# Altium footprint library lib_datalogger.PcbLib: 866 footprints (part 54 of 55)
Each footprint in its own frame and in the unit in brackets; x right, y up, seen from the top. Pads: shape width x height; smd on the part's side, far side on the other; paste and mask are expansions set on the pad; w line width, h text height; cw(c..) or ccw(c..) is an arc to the next point about the centre after c.
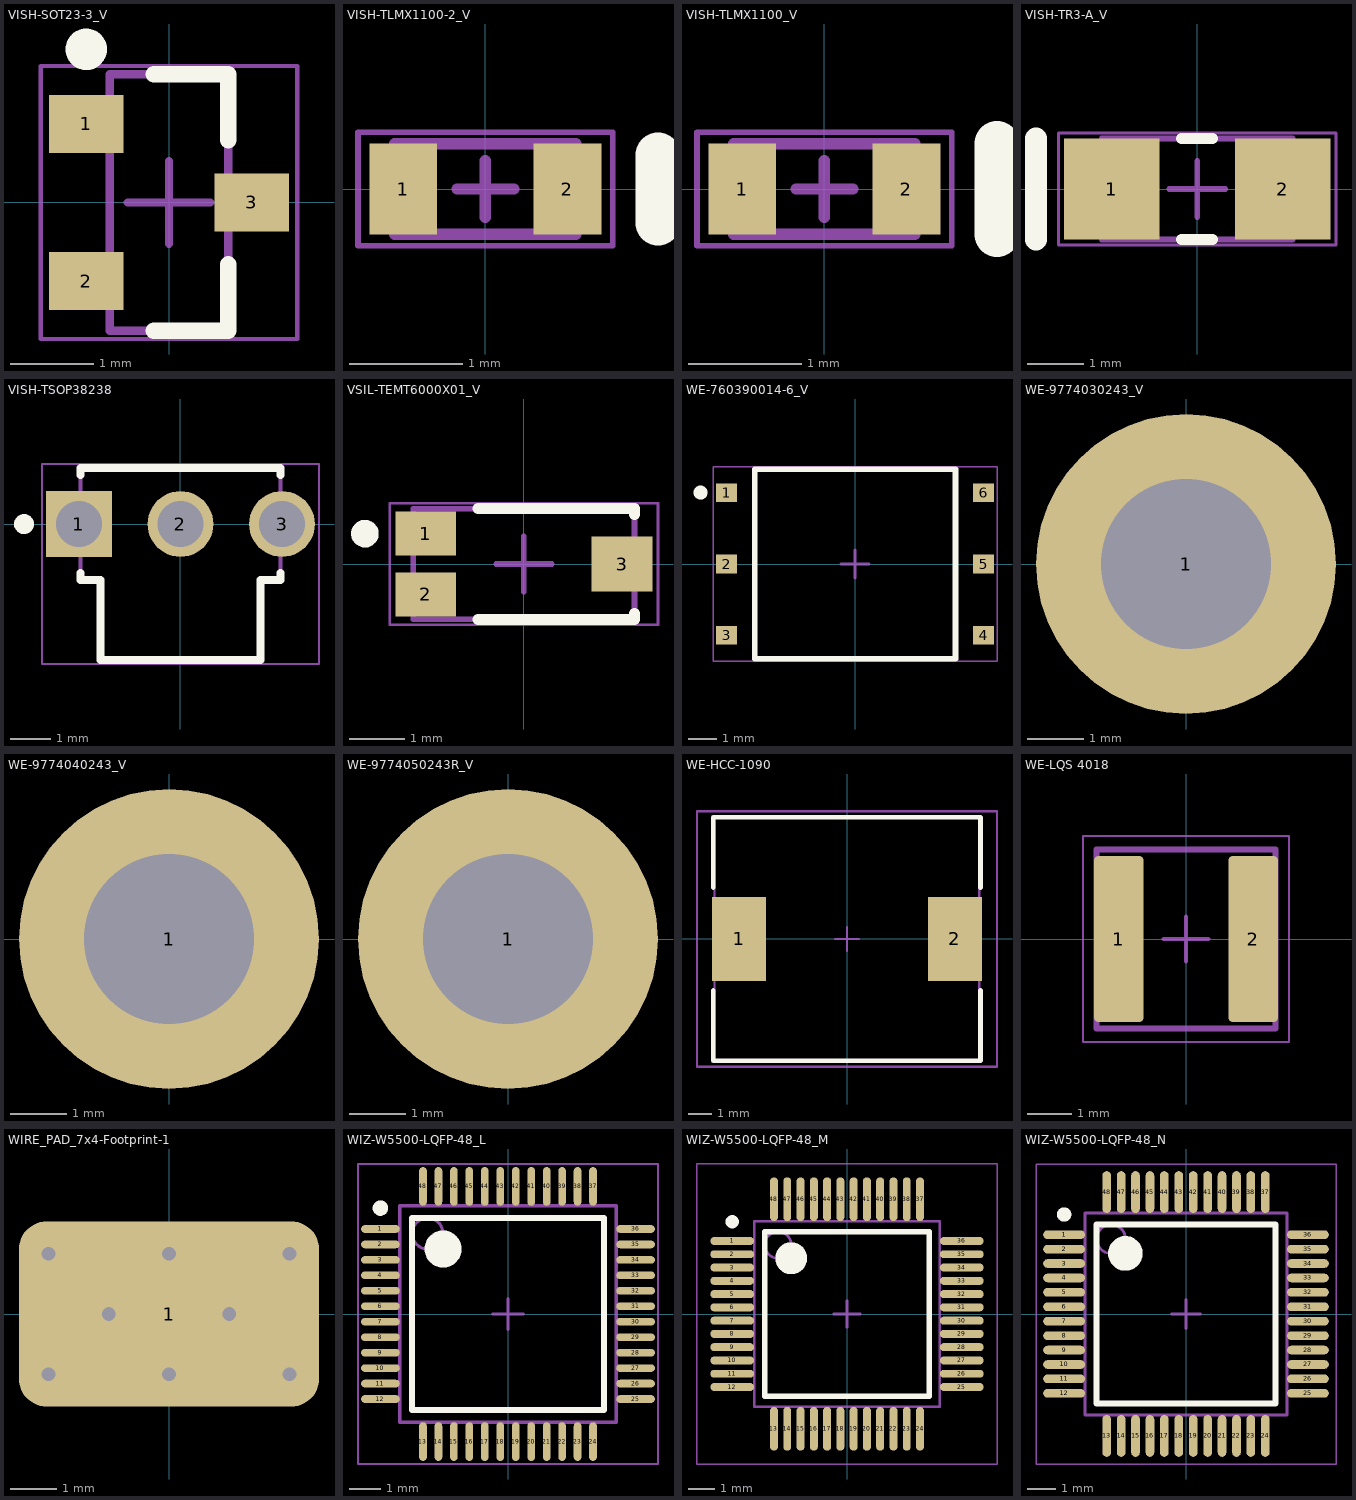
[diagram p53: the footprints below, top view; thin cyan lines are the x and y axes]

## VISH-SOT23-3_V [mm] "SOT23, 3-Leads, Body 3.1x1.43mm, Pitch 0.95mm"
height 1.15
pads (3):
  rect 0.9x0.7 smd: 1(-1,0.95) 2(-1,-0.95) 3(1,0)
Top Overlay:
  circle w0.25: c-1,1.85 r0.125
  lines w0.2: -0.185,-1.55 0.715,-1.55 0.715,-0.75 ; -0.185,1.55 0.715,1.55 0.715,0.75
Mechanical 13:
  lines w0.1: -0.715,-1.55 0.715,-1.55 0.715,1.55 -0.715,1.55 -0.715,-1.55
Mechanical 15:
  lines w0.05: -1.55,-1.65 1.55,-1.65 1.55,1.65 -1.55,1.65 -1.55,-1.65
  lines w0.1: -0.5,0 0.5,0 ; 0,-0.5 0,0.5
3D body "SOT95P248X115-3L.step": height 1.15, standoff 0, extent -1.3,-1.55 1.3,1.55

## VISH-TLMX1100-2_V [mm] "SMD, 2-Leads, Body 1.6x0.8mm"
height 0.65
pads (2):
  rect 0.6x0.8 smd: 1(-0.725,0) 2(0.725,0)
Top Overlay:
  lines w0.4: 1.525,-0.3 1.525,0.3
Mechanical 13:
  lines w0.1: -0.8,-0.4 0.8,-0.4 0.8,0.4 -0.8,0.4 -0.8,-0.4
Mechanical 15:
  lines w0.05: -1.125,-0.5 1.125,-0.5 1.125,0.5 -1.125,0.5 -1.125,-0.5
  lines w0.1: -0.25,0 0.25,0 ; 0,-0.25 0,0.25
3D body: height 0.65, standoff 0, extent -0.8,-0.4 0.8,0.4

## VISH-TLMX1100_V [mm] "SMD, 2-Leads, Body 1.6x0.8mm"
height 0.65
pads (2):
  rect 0.6x0.8 smd: 1(-0.725,0) 2(0.725,0)
Top Overlay:
  lines w0.4: 1.525,-0.4 1.525,0.4
Mechanical 13:
  lines w0.1: -0.8,-0.4 0.8,-0.4 0.8,0.4 -0.8,0.4 -0.8,-0.4
Mechanical 15:
  lines w0.05: -1.125,-0.5 -1.125,0.5 1.125,0.5 1.125,-0.5 -1.125,-0.5
  lines w0.1: -0.25,0 0.25,0 ; 0,-0.25 0,0.25
3D body: height 0.65, standoff 0, extent -0.8,-0.4 0.8,0.4

## VISH-TR3-A_V [mm] "Molded Capacitor, 2-Leads, Body 3.40x1.80mm"
height 1.8
pads (2):
  rect 1.7x1.8 smd: 1(-1.525,0) 2(1.525,0)
Top Overlay:
  lines w0.2: -0.275,-0.9 0.275,-0.9 ; -0.275,0.9 0.275,0.9
  lines w0.4: -2.875,-0.9 -2.875,0.9
Mechanical 13:
  rectangle: -1.7,-0.9 -1.243,0.9
  lines w0.1: -1.7,-0.9 1.7,-0.9 1.7,0.9 -1.7,0.9 -1.7,-0.9
Mechanical 15:
  lines w0.05: -2.475,-1 2.475,-1 2.475,1 -2.475,1 -2.475,-1
  lines w0.1: -0.5,0 0.5,0 ; 0,-0.5 0,0.5
3D body "CAPMP3216X18L.step": height 1.8, standoff 0, extent -1.92,-0.9 1.92,0.9

## VISH-TSOP38238 [mm] "TH, 3-Leads, Body 5.00x4.80mm, Pitch 2.54mm"
height 8.55
pads (3):
  rect 1.65x1.65 hole 1.15: 1(-2.54,0)
  round 1.65 hole 1.15: 2(0,0) 3(2.54,0)
Top Overlay:
  circle w0.25: c-3.915,0 r0.125
  lines w0.2: -2.5,-1.4 -2.5,-1.225 ; -2.5,1.225 -2.5,1.4 2.5,1.4 2.5,1.225 ; -2.5,-1.4 -2,-1.4 -2,-3.4 2,-3.4 2,-1.4 2.5,-1.4 2.5,-1.225
Mechanical 13:
  lines w0.1: -2.5,-1.4 -2,-1.4 -2,-3.4 2,-3.4 2,-1.4 2.5,-1.4 2.5,1.4 -2.5,1.4 -2.5,-1.4
Mechanical 15:
  lines w0.05: -3.465,-3.5 3.465,-3.5 3.465,1.5 -3.465,1.5 -3.465,-3.5
  lines w0.1: -0.5,0 0.5,0 ; 0,-0.5 0,0.5
3D body: height 1.3, standoff -22.83, extent -2.89,-0.25 -2.19,0.25
3D body: height 1.3, standoff -22.83, extent -0.35,-0.25 0.35,0.25
3D body: height 1.3, standoff -22.83, extent 2.19,-0.25 2.89,0.25
3D body: height 7.55, standoff 1.3, extent -2,-3.4 2,-1.4
3D body: height 8.55, standoff 1.3, extent -2.5,-1.4 2.5,1.4

## VSIL-TEMT6000X01_V [mm] "SMD, 3-Leads, Body 4x2mm"
height 1.2
pads (3):
  rect 1.1x0.8 smd: 1(-1.775,0.55) 2(-1.775,-0.55)
  rect 1.1x1 smd: 3(1.775,0)
Top Overlay:
  circle w0.25: c-2.875,0.55 r0.125
  lines w0.2: -0.828,-1 2,-1 2,-0.9 ; -0.828,1 2,1 2,0.9
Mechanical 13:
  lines w0.1: -2,-1 2,-1 2,1 -2,1 -2,-1
Mechanical 15:
  lines w0.05: -2.425,-1.1 -2.425,1.1 2.425,1.1 2.425,-1.1 -2.425,-1.1
  lines w0.1: -0.5,0 0.5,0 ; 0,-0.5 0,0.5
3D body: height 0.45, standoff 0, extent -2,-1 2,1
3D body: height 1.05, standoff 0.45, extent -1.2,-1 1.2,1

## WE-760390014-6_V [mm] "SMD, 6-Leads, Body 7.14x6.73mm, Pitch 2.54mm"
height 4.19
pads (6):
  rect 0.75x0.66 smd: 1(-4.57,2.54) 2(-4.57,0) 3(-4.57,-2.54) 4(4.57,-2.54) 5(4.57,0) 6(4.57,2.54)
Top Overlay:
  circle w0.25: c-5.495,2.54 r0.125
  lines w0.2: -3.57,-3.365 -3.57,3.365 3.57,3.365 3.57,-3.365 -3.57,-3.365
Mechanical 13:
  lines w0.1: -3.57,-3.365 -3.57,3.365 3.57,3.365 3.57,-3.365 -3.57,-3.365
Mechanical 15:
  lines w0.05: -5.045,-3.465 -5.045,3.465 5.045,3.465 5.045,-3.465 -5.045,-3.465
  lines w0.1: -0.5,0 0.5,0 ; 0,-0.5 0,0.5
3D body: height 4.19, standoff 0, extent -3.57,-3.365 3.57,3.365

## WE-9774030243_V [mm] "Round Standoff M2 Steel Spacer"
height 3
pads (1):
  round 5.3 / inner round 0 / far side round 0 hole 3: 1(0,0)
Mechanical 13:
  circle w0.05: c0,0 r2.225
  lines w0.1: -0.5,0 0.5,0 ; 0,-0.5 0,0.5
Top 3D Body:
  circle w0.1: c0,0 r2.175
Top Designator:
  text ".Designator" at -1.27,-3.175 h0.6
3D body "9774030243 (rev1).stp": height 3, standoff -1.4, extent -2.175,-2.172 2.175,2.172

## WE-9774040243_V [mm] "Round Standoff M2 Steel Spacer"
height 4
pads (1):
  round 5.3 / inner round 0 / far side round 0 hole 3: 1(0,0)
Mechanical 13:
  circle w0.05: c0,0 r2.225
  lines w0.1: -0.5,0 0.5,0 ; 0,-0.5 0,0.5
Top 3D Body:
  circle w0.1: c0,0 r2.175
Top Designator:
  text ".Designator" at -1.27,-3.683 h0.6
3D body "9774040243R (rev1).stp": height 4, standoff -1.4, extent -2.175,-2.172 2.175,2.172

## WE-9774050243R_V [mm] "Round Standoff M2 Steel Spacer"
height 5
pads (1):
  round 5.3 / inner round 0 / far side round 0 hole 3: 1(0,0)
Mechanical 13:
  circle w0.1: c0,0 r2.175
Mechanical 15:
  circle w0.05: c0,0 r2.225
  lines w0.1: -0.5,0 0.5,0 ; 0,-0.5 0,0.5
Top Designator:
  text ".Designator" at -1.397,-3.302 h0.6
3D body "9774050243R.stp": height 5, standoff -1.4, extent -2.175,-2.172 2.175,2.172

## WE-HCC-1090 [mm] "Inductor, 2-Leads, Body 10.9 x 10.0 mm"
height 9.7
pads (2):
  rect 2.3x3.6 smd: 1(-4.6,0) 2(4.6,0)
Top Overlay:
  lines w0.2: -5.7,-2.2 -5.7,-5.2 5.7,-5.2 5.7,-2.2 ; -5.7,2.2 -5.7,5.2 5.7,5.2 5.7,2.2
Mechanical 13:
  lines w0.1: -5.65,-5.2 -5.65,5.2 5.65,5.2 5.65,-5.2 -5.65,-5.2
Mechanical 15:
  lines w0.1: -0.5,0 0.5,0 ; 0,-0.5 0,0.5 ; -6.4,-5.45 -6.4,5.45 6.4,5.45 6.4,-5.45 -6.4,-5.45
3D body "744333xxxx.stp": height 9.29, standoff -0.01, extent -5.125,-5 5.125,5

## WE-LQS 4018 [mm] "SMD Power Inductor, 2-Leads, Body 4.0x4.0mm"
height 1.8
pads (2):
  rrect15% 1.1x3.7 smd: 1(-1.5,0) 2(1.5,0)
Mechanical 13:
  lines w0.127: -2,-2 2,-2 2,2 -2,2 -2,-2
Mechanical 15:
  lines w0.05: -2.3,-2.3 2.3,-2.3 2.3,2.3 -2.3,2.3 -2.3,-2.3
  lines w0.1: -0.5,0 0.5,0 ; 0,-0.5 0,0.5
Top Designator:
  text ".Designator" at 0.127,-1.27 h0.6
3D body "LQS_4018.stp": height 1.78, standoff -0.02, extent -2,-2 2,2

## WIRE_PAD_7x4-Footprint-1 [mm]
pads (1):
  rrect30% 6.472x4 smd mask+0.102: 1(0,0)
via -2.6,-1.3 diameter 0.6 hole 0.3
via -2.6,1.3 diameter 0.6 hole 0.3
via 0,1.3 diameter 0.6 hole 0.3
via 0,-1.3 diameter 0.6 hole 0.3
via 2.6,1.3 diameter 0.6 hole 0.3
via 2.6,-1.3 diameter 0.6 hole 0.3
via 1.3,0 diameter 0.6 hole 0.3
via -1.3,0 diameter 0.6 hole 0.3
Top Designator:
  text ".Designator" at -2.159,2.413 h0.6

## WIZ-W5500-LQFP-48_L [mm] "LQFP, 48-Leads, Body 7.00x7.00mm, Pitch 0.50mm, IPC High Density"
height 1.6
pads (48):
  oval 1.25x0.25 smd: 1(-4.125,2.75) 2(-4.125,2.25) 3(-4.125,1.75) 4(-4.125,1.25) 5(-4.125,0.75) 6(-4.125,0.25) 7(-4.125,-0.25) 8(-4.125,-0.75) 9(-4.125,-1.25) 10(-4.125,-1.75) 11(-4.125,-2.25) 12(-4.125,-2.75) 25(4.125,-2.75) 26(4.125,-2.25) 27(4.125,-1.75) 28(4.125,-1.25) 29(4.125,-0.75) 30(4.125,-0.25) 31(4.125,0.25) 32(4.125,0.75) 33(4.125,1.25) 34(4.125,1.75) 35(4.125,2.25) 36(4.125,2.75)
  oval 0.25x1.25 smd: 13(-2.75,-4.125) 14(-2.25,-4.125) 15(-1.75,-4.125) 16(-1.25,-4.125) 17(-0.75,-4.125) 18(-0.25,-4.125) 19(0.25,-4.125) 20(0.75,-4.125) 21(1.25,-4.125) 22(1.75,-4.125) 23(2.25,-4.125) 24(2.75,-4.125) 37(2.75,4.125) 38(2.25,4.125) 39(1.75,4.125) 40(1.25,4.125) 41(0.75,4.125) 42(0.25,4.125) 43(-0.25,4.125) 44(-0.75,4.125) 45(-1.25,4.125) 46(-1.75,4.125) 47(-2.25,4.125) 48(-2.75,4.125)
Top Overlay:
  circle w0.25: c-4.125,3.425 r0.125
  circle w0.6: c-2.1,2.1 r0.3
  lines w0.2: -3.1,-3.1 -3.1,3.1 3.1,3.1 3.1,-3.1 -3.1,-3.1
Mechanical 13:
  circle w0.1: c-2.6,2.6 r0.5
  lines w0.1: -3.5,-3.5 -3.5,3.5 3.5,3.5 3.5,-3.5 -3.5,-3.5
Mechanical 15:
  lines w0.05: -4.85,-4.85 -4.85,4.85 4.85,4.85 4.85,-4.85 -4.85,-4.85
  lines w0.1: -0.5,0 0.5,0 ; 0,-0.5 0,0.5
3D body "TSQFP50P900X900X160-48L.step": height 1.6, standoff 0, extent -4.5,-4.5 4.5,4.5

## WIZ-W5500-LQFP-48_M [mm] "LQFP, 48-Leads, Body 7.00x7.00mm, Pitch 0.50mm, IPC Low Density"
height 1.6
pads (48):
  oval 1.65x0.3 smd: 1(-4.325,2.75) 2(-4.325,2.25) 3(-4.325,1.75) 4(-4.325,1.25) 5(-4.325,0.75) 6(-4.325,0.25) 7(-4.325,-0.25) 8(-4.325,-0.75) 9(-4.325,-1.25) 10(-4.325,-1.75) 11(-4.325,-2.25) 12(-4.325,-2.75) 25(4.325,-2.75) 26(4.325,-2.25) 27(4.325,-1.75) 28(4.325,-1.25) 29(4.325,-0.75) 30(4.325,-0.25) 31(4.325,0.25) 32(4.325,0.75) 33(4.325,1.25) 34(4.325,1.75) 35(4.325,2.25) 36(4.325,2.75)
  oval 0.3x1.65 smd: 13(-2.75,-4.325) 14(-2.25,-4.325) 15(-1.75,-4.325) 16(-1.25,-4.325) 17(-0.75,-4.325) 18(-0.25,-4.325) 19(0.25,-4.325) 20(0.75,-4.325) 21(1.25,-4.325) 22(1.75,-4.325) 23(2.25,-4.325) 24(2.75,-4.325) 37(2.75,4.325) 38(2.25,4.325) 39(1.75,4.325) 40(1.25,4.325) 41(0.75,4.325) 42(0.25,4.325) 43(-0.25,4.325) 44(-0.75,4.325) 45(-1.25,4.325) 46(-1.75,4.325) 47(-2.25,4.325) 48(-2.75,4.325)
Top Overlay:
  circle w0.25: c-4.325,3.475 r0.125
  circle w0.6: c-2.1,2.1 r0.3
  lines w0.2: -3.1,-3.1 -3.1,3.1 3.1,3.1 3.1,-3.1 -3.1,-3.1
Mechanical 13:
  circle w0.1: c-2.6,2.6 r0.5
  lines w0.1: -3.5,-3.5 -3.5,3.5 3.5,3.5 3.5,-3.5 -3.5,-3.5
Mechanical 15:
  lines w0.05: -5.65,-5.65 -5.65,5.65 5.65,5.65 5.65,-5.65 -5.65,-5.65
  lines w0.1: -0.5,0 0.5,0 ; 0,-0.5 0,0.5
3D body "TSQFP50P900X900X160-48L.step": height 1.6, standoff 0, extent -4.5,-4.5 4.5,4.5

## WIZ-W5500-LQFP-48_N [mm] "LQFP, 48-Leads, Body 7.00x7.00mm, Pitch 0.50mm, IPC Medium Density"
height 1.6
pads (48):
  oval 1.45x0.3 smd: 1(-4.225,2.75) 2(-4.225,2.25) 3(-4.225,1.75) 4(-4.225,1.25) 5(-4.225,0.75) 6(-4.225,0.25) 7(-4.225,-0.25) 8(-4.225,-0.75) 9(-4.225,-1.25) 10(-4.225,-1.75) 11(-4.225,-2.25) 12(-4.225,-2.75) 25(4.225,-2.75) 26(4.225,-2.25) 27(4.225,-1.75) 28(4.225,-1.25) 29(4.225,-0.75) 30(4.225,-0.25) 31(4.225,0.25) 32(4.225,0.75) 33(4.225,1.25) 34(4.225,1.75) 35(4.225,2.25) 36(4.225,2.75)
  oval 0.3x1.45 smd: 13(-2.75,-4.225) 14(-2.25,-4.225) 15(-1.75,-4.225) 16(-1.25,-4.225) 17(-0.75,-4.225) 18(-0.25,-4.225) 19(0.25,-4.225) 20(0.75,-4.225) 21(1.25,-4.225) 22(1.75,-4.225) 23(2.25,-4.225) 24(2.75,-4.225) 37(2.75,4.225) 38(2.25,4.225) 39(1.75,4.225) 40(1.25,4.225) 41(0.75,4.225) 42(0.25,4.225) 43(-0.25,4.225) 44(-0.75,4.225) 45(-1.25,4.225) 46(-1.75,4.225) 47(-2.25,4.225) 48(-2.75,4.225)
Top Overlay:
  circle w0.6: c-2.1,2.1 r0.3
  circle w0.25: c-4.225,3.45 r0.125
  lines w0.2: -3.1,-3.1 3.1,-3.1 3.1,3.1 -3.1,3.1 -3.1,-3.1
Mechanical 13:
  circle w0.1: c-2.6,2.6 r0.5
  lines w0.1: -3.5,-3.5 3.5,-3.5 3.5,3.5 -3.5,3.5 -3.5,-3.5
Mechanical 15:
  lines w0.05: -5.2,-5.2 5.2,-5.2 5.2,5.2 -5.2,5.2 -5.2,-5.2
  lines w0.1: -0.5,0 0.5,0 ; 0,-0.5 0,0.5
3D body "TSQFP50P900X900X160-48L.step": height 1.6, standoff 0, extent -4.5,-4.5 4.5,4.5